# Altium schematic symbol library LTSpiceLibrary.SchLib: 776 symbols (part 2 of 3) (continued)
## LT6109-1
designator X?  value LT6109-1  InstName: X?
Prefix: X; Description: High Side Current Sense Amplifier with Reference and Comparators\n\nNote: The reset signal must be applied on startup.  Model does not reflect this.; SpiceModel: LTC5.lib; Value2: LT6109-1
pins: 1 SenseLo, 2 EN/_RST, 3 OutC2, 4 OutC1, 5 V-, 6 INC1, 7 INC2, 8 OutA, 9 V+, 10 SenseHi

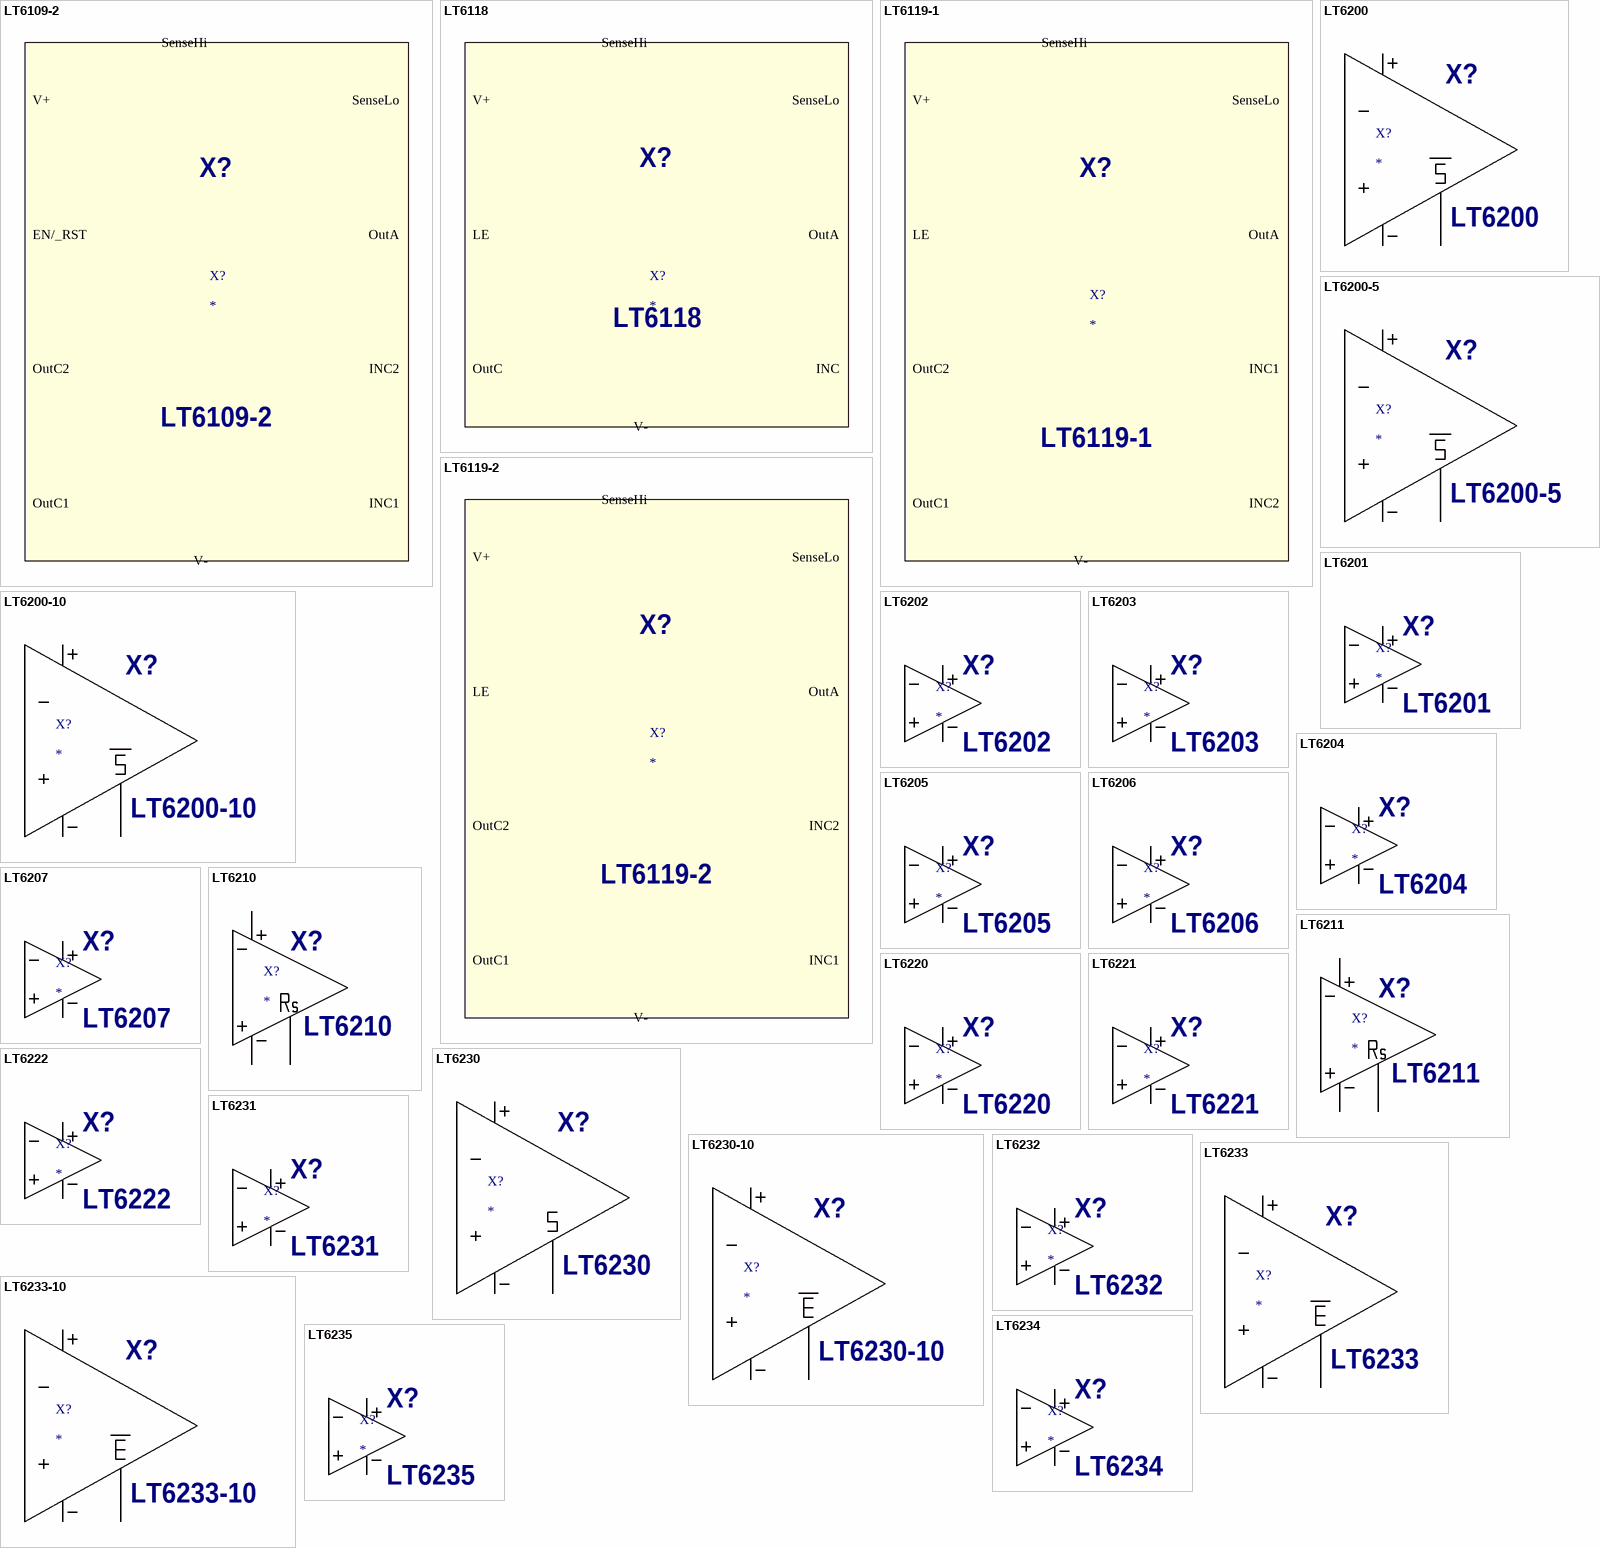
[diagram p15: symbols LT6109-2 to LT6235]

## LT6109-2
designator X?  value LT6109-2  InstName: X?
Prefix: X; Description: High Side Current Sense Amplifier with Reference and Comparators\n\nNote: The reset signal must be applied on startup.  Model does not reflect this.; SpiceModel: LTC5.lib; Value2: LT6109-2
pins: 1 SenseLo, 2 EN/_RST, 3 OutC2, 4 OutC1, 5 V-, 6 INC1, 7 INC2, 8 OutA, 9 V+, 10 SenseHi

## LT6118
designator X?  value LT6118  InstName: X?
Prefix: X; Description: Current Sense Amplifier Reference and Comparator with POR; SpiceModel: LTC5.lib; Value2: LT6118
pins: 1 SenseLo, 2 LE, 3 OutC, 4 V-, 5 INC, 6 OutA, 7 V+, 8 SenseHi

## LT6119-1
designator X?  value LT6119-1  InstName: X?
Prefix: X; Description: Current Sense Amplifier, Reference and Comparators with POR; SpiceModel: LTC5.lib; Value2: LT6119-1
pins: 1 SenseLo, 2 LE, 3 OutC2, 4 OutC1, 5 V-, 6 INC1, 7 INC2, 8 OutA, 9 V+, 10 SenseHi

## LT6119-2
designator X?  value LT6119-2  InstName: X?
Prefix: X; Description: Current Sense Amplifier, Reference and Comparators with POR; SpiceModel: LTC5.lib; Value2: LT6119-2
pins: 1 SenseLo, 2 LE, 3 OutC2, 4 OutC1, 5 V-, 6 INC1, 7 INC2, 8 OutA, 9 V+, 10 SenseHi

## LT6200
designator X?  value LT6200  InstName: X?
Prefix: X; Description: 165 MHz, Rail-to-Rail Input and Output, 0.95nV/rtHz Low Noise Op Amp; SpiceModel: LTC2.LIB; Value2: LT6200
pins: 1 IN+, 2 IN-, 3 OUT, 4 VCC, 5 VEE, 6 SHDN_L

## LT6200-5
designator X?  value LT6200-5  InstName: X?
Prefix: X; Description: 800MHz, Av=5 Rail-to-Rail Low Noise Op Amp; SpiceModel: LTC2.LIB; Value2: LT6200-5
pins: 1 IN+, 2 IN-, 3 OUT, 4 VCC, 5 VEE, 6 SHDN_L

## LT6200-10
designator X?  value LT6200-10  InstName: X?
Prefix: X; Description: 1600MHz, Av=10 Rail-to-Rail Low Noise Op Amp; SpiceModel: LTC2.LIB; Value2: LT6200-10
pins: 1 IN+, 2 IN-, 3 OUT, 4 VCC, 5 VEE, 6 SHDN_L

## LT6201
designator X?  value LT6201  InstName: X?
Prefix: X; Description: Dual 165 MHz, Rail-to-Rail, 0.95 nV/rtHz Low Noise Op Amp; SpiceModel: LTC2.LIB; Value2: LT6201
pins: 1 IN+, 2 IN-, 3 OUT, 4 VCC, 5 VEE

## LT6202
designator X?  value LT6202  InstName: X?
Prefix: X; Description: 100 MHz, Rail-to-Rail, 1.9nV/rtHz Low Power Op Amp; SpiceModel: LTC2.LIB; Value2: LT6202
pins: 1 IN+, 2 IN-, 3 OUT, 4 VCC, 5 VEE

## LT6203
designator X?  value LT6203  InstName: X?
Prefix: X; Value2: LT6202; Description: Dual 100 MHz, Rail-to-Rail, 1.9nV/rtHz Low Power Op Amp; SpiceModel: LTC2.LIB
pins: 1 IN+, 2 IN-, 3 OUT, 4 VCC, 5 VEE

## LT6204
designator X?  value LT6204  InstName: X?
Prefix: X; Value2: LT6202; Description: Quad 100 MHz, Rail-to-Rail, 1.9nV/rtHz Low Power Op Amp; SpiceModel: LTC2.LIB
pins: 1 IN+, 2 IN-, 3 OUT, 4 VCC, 5 VEE

## LT6205
designator X?  value LT6205  InstName: X?
Prefix: X; Description: Single Supply 3V, 100MHz Video Op Amp; SpiceModel: LTC2.LIB; Value2: LT6205
pins: 1 IN+, 2 IN-, 3 OUT, 4 VCC, 5 VEE

## LT6206
designator X?  value LT6206  InstName: X?
Prefix: X; Value2: LT6205; Description: Dual Single Supply 3V, 100MHz Video Op Amp; SpiceModel: LTC2.LIB
pins: 1 IN+, 2 IN-, 3 OUT, 4 VCC, 5 VEE

## LT6207
designator X?  value LT6207  InstName: X?
Prefix: X; Value2: LT6205; Description: Quad Single Supply 3V, 100MHz Video Op Amp; SpiceModel: LTC2.LIB
pins: 1 IN+, 2 IN-, 3 OUT, 4 VCC, 5 VEE

## LT6210
designator X?  value LT6210  InstName: X?
Prefix: X; Description: Programmable Supply Current, R-R Output, Current Feedback Amplifier; SpiceModel: LTC4.lib; Value2: LT6210
pins: 1 In+, 2 In-, 3 V+, 4 V-, 5 OUT, 6 V-1

## LT6211
designator X?  value LT6211  InstName: X?
Prefix: X; Value2: LT6210; Description: Dual Programmable Supply Current, R-R Output, Current Feedback Amplifier; SpiceModel: LTC4.lib
pins: 1 In+, 2 In-, 3 V+, 4 V-, 5 OUT, 6 V-1

## LT6220
designator X?  value LT6220  InstName: X?
Prefix: X; Description: 60MHz, 20V/�s, Low Power, RRIO Precision Op Amp; SpiceModel: LTC4.LIB; Value2: LT6220
pins: 1 IN+, 2 IN-, 3 VCC, 4 VEE, 5 OUT

## LT6221
designator X?  value LT6221  InstName: X?
Prefix: X; Value2: LT6220; Description: Dual 60MHz, 20V/�s, Low Power, RRIO Precision Op Amp; SpiceModel: LTC4.LIB
pins: 1 IN+, 2 IN-, 3 VCC, 4 VEE, 5 OUT

## LT6222
designator X?  value LT6222  InstName: X?
Prefix: X; Value2: LT6220; Description: Quad 60MHz, 20V/�s, Low Power, RRIO Precision Op Amp; SpiceModel: LTC4.LIB
pins: 1 IN+, 2 IN-, 3 VCC, 4 VEE, 5 OUT

## LT6230
designator X?  value LT6230  InstName: X?
Prefix: X; Description: 215 MHz, Rail-to-Rail Output, 1.1nV/rtHz, 3.4mA Op Amp; SpiceModel: LTC2.LIB; Value2: LT6230
pins: 1 IN+, 2 IN-, 3 OUT, 4 VCC, 5 VEE, 6 SHDN

## LT6230-10
designator X?  value LT6230-10  InstName: X?
Prefix: X; Description: 1.45GHz, Av=10, Rail-to-Rail Output, Low Noise, 3.4mA Op Amp; SpiceModel: LTC2.LIB; Value2: LT6230-10
pins: 1 IN+, 2 IN-, 3 OUT, 4 VCC, 5 VEE, 6 EN_L

## LT6231
designator X?  value LT6231  InstName: X?
Prefix: X; Description: Dual 215 MHz, Rail-to-Rail Output, 1.1nV/rtHz, 3.4mA Op Amp; SpiceModel: LTC2.LIB; Value2: LT6231
pins: 1 IN+, 2 IN-, 3 OUT, 4 VCC, 5 VEE

## LT6232
designator X?  value LT6232  InstName: X?
Prefix: X; Value2: LT6231; Description: Quad 215 MHz, Rail-to-Rail Output, 1.1nV/rtHz, 3.4mA Op Amp; SpiceModel: LTC2.LIB
pins: 1 IN+, 2 IN-, 3 OUT, 4 VCC, 5 VEE

## LT6233
designator X?  value LT6233  InstName: X?
Prefix: X; Description: 60MHz, Rail-to-Rail Output, 1.9nV/rtHz, 1.2mA Op Amp; SpiceModel: LTC2.LIB; Value2: LT6233
pins: 1 IN+, 2 IN-, 3 OUT, 4 VCC, 5 VEE, 6 EN_L

## LT6233-10
designator X?  value LT6233-10  InstName: X?
Prefix: X; Description: 375MHz, AV=10, Rail-to-Rail Output, 1.9nV/rtHz, 1.2mA Op Amp; SpiceModel: LTC2.LIB; Value2: LT6233-10
pins: 1 IN+, 2 IN-, 3 OUT, 4 VCC, 5 VEE, 6 EN_L

## LT6234
designator X?  value LT6234  InstName: X?
Prefix: X; Description: Dual 60MHz, Rail-to-Rail Output, 1.9nV/rtHz, 1.2mA Op Amp; SpiceModel: LTC2.LIB; Value2: LT6234
pins: 1 IN+, 2 IN-, 3 OUT, 4 VCC, 5 VEE

## LT6235
designator X?  value LT6235  InstName: X?
Prefix: X; Value2: LT6234; Description: Quad 60MHz, Rail-to-Rail Output, 1.9nV/rtHz, 1.2mA Op Amp; SpiceModel: LTC2.LIB
pins: 1 IN+, 2 IN-, 3 OUT, 4 VCC, 5 VEE

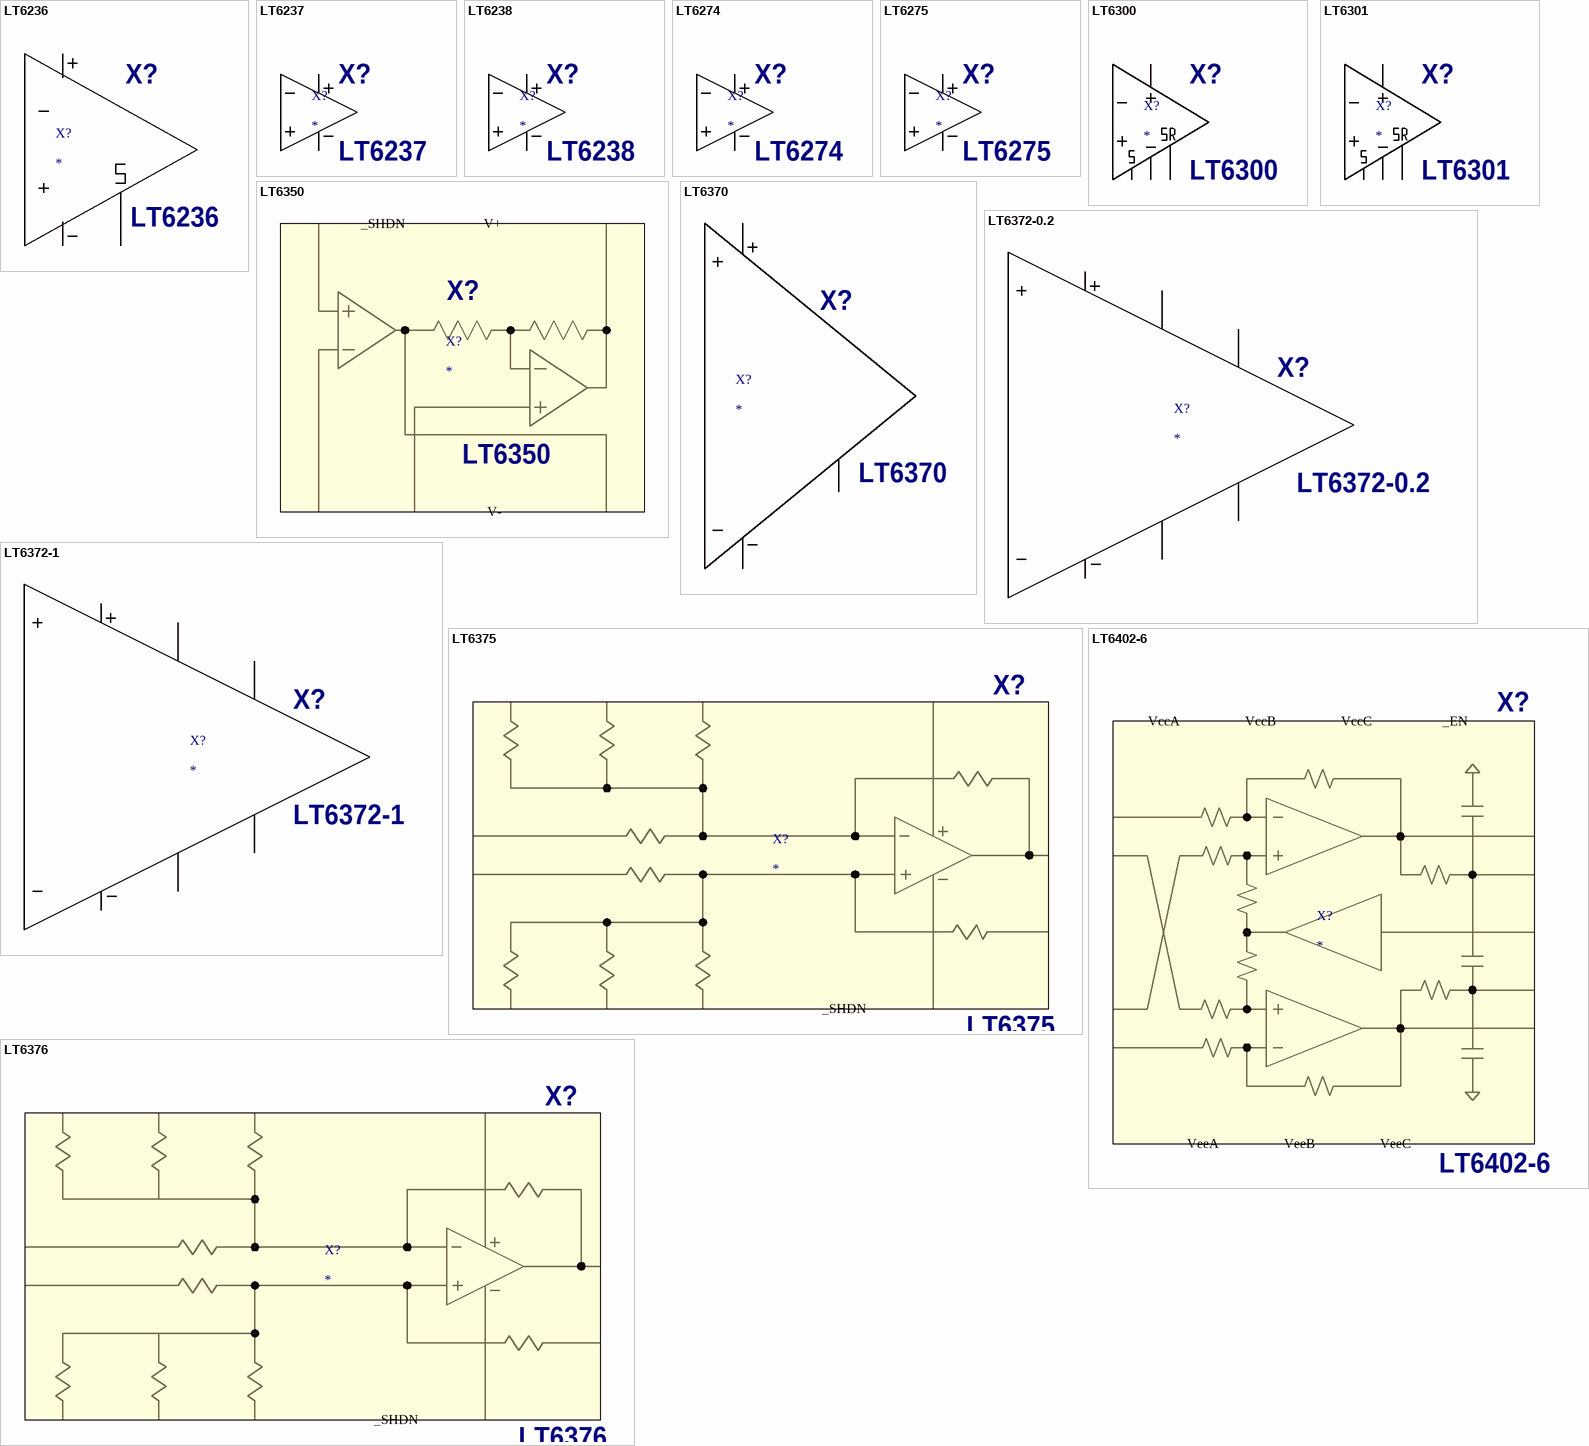
[diagram p16: symbols LT6236 to LT6402-6]

## LT6236
designator X?  value LT6236  InstName: X?
Prefix: X; Description: 215 MHz, Rail-to-Rail Output, 1.1nV/rtHz Op Amp/SAR ADC Driver; SpiceModel: LTC7.lib; Value2: LT6236
pins: 1 IN+, 2 IN-, 3 OUT, 4 VCC, 5 VEE, 6 SHDN

## LT6237
designator X?  value LT6237  InstName: X?
Prefix: X; Description: Dual 215 MHz, Rail-to-Rail Output, 1.1nV/rtHz Op Amp/SAR ADC Driver; SpiceModel: LTC7.lib; Value2: LT6237
pins: 1 IN+, 2 IN-, 3 OUT, 4 VCC, 5 VEE

## LT6238
designator X?  value LT6238  InstName: X?
Prefix: X; Value2: LT6237; Description: Quad 215 MHz, Rail-to-Rail Output, 1.1nV/rtHz Op Amp/SAR ADC Driver; SpiceModel: LTC7.lib
pins: 1 IN+, 2 IN-, 3 OUT, 4 VCC, 5 VEE

## LT6274
designator X?  value LT6274  InstName: X?
Prefix: X; Value2: LT6275; Description: 90MHz, 2200V/�s 30V Low Power Op Amp; SpiceModel: LTC7.lib
pins: 1 In+, 2 In-, 3 V+, 4 V-, 5 OUT

## LT6275
designator X?  value LT6275  InstName: X?
Prefix: X; Description: Dual 90MHz, 2200V/�s 30V Low Power Op Amp; SpiceModel: LTC7.lib; Value2: LT6275
pins: 1 In+, 2 In-, 3 V+, 4 V-, 5 OUT

## LT6300
designator X?  value LT6300  InstName: X?
Prefix: X; Value2: LT1794; Description: 500mA, 200MHz xDSL Line Driver in 16-Lead SSOP Package; SpiceModel: LTC1.lib
pins: 1 In+, 2 In-, 3 V+, 4 V-, 5 OUT, 6 S, 7 SR

## LT6301
designator X?  value LT6301  InstName: X?
Prefix: X; Value2: LT1794; Description: Dual 500mA, Differential  xDSL Line Driver in 28-Lead TSSOP Package; SpiceModel: LTC1.lib
pins: 1 In+, 2 In-, 3 V+, 4 V-, 5 OUT, 6 S, 7 SR

## LT6350
designator X?  value LT6350  InstName: X?
Prefix: X; Description: Single-Ended to Differential Converter/ADC Driver; Value2: LT6350; SpiceModel: LTC7.lib
pins: 1 -IN1, 2 +IN2, 3 V+, 4 OUT1, 5 OUT2, 6 V-, 7 _SHDN, 8 +IN1

## LT6370
designator X?  value LT6370  InstName: X?
Prefix: X; Description: Precision, Low Drift, Low Noise, Instrumentation Amplifier; SpiceModel: LTC1.lib; Value2: LT6370
pins: 1 -RG, 2 IN-, 3 IN+, 4 -V, 5 REF, 6 OUT, 7 +V, 8 +RG

## LT6372-0.2
designator X?  value LT6372-0.2  InstName: X?
Prefix: X; Description: Precision, Low Drift, Low Noise, Funneling Instrumentation Amplifier; SpiceModel: LT6372-0.2.sub; Value2: LT6372-0.2
pins: 1 -RGF, 2 IN-, 3 IN+, 4 -V, 5 REF1, 6 OUT, 7 +V, 8 +RGF, 9 -RGS, 10 +RGS, 11 REF2, 12 CLHI, 13 CLLO

## LT6372-1
designator X?  value LT6372-1  InstName: X?
Prefix: X; Description: Precision, Low Drift, Low Noise, Instrumentation Amplifier; SpiceModel: LTC2.lib; Value2: LT6372-1
pins: 1 -RGF, 2 IN-, 3 IN+, 4 -V, 5 REF1, 6 OUT, 7 +V, 8 +RGF, 9 -RGS, 10 +RGS, 11 REF2, 12 CLHI, 13 CLLO

## LT6375
designator X?  value LT6375  InstName: X?
Prefix: X; Description: +/-270 Volt Common Mode Voltage Difference Amplifier; SpiceModel: LTC3.lib; Value2: LT6375
pins: 1 +IN, 2 +REFA, 3 +REFB, 4 +REFC, 5 REF, 6 _SHDN, 7 OUT, 8 V+, 9 -REFC, 10 -REFB, 11 -REFA, 12 -IN, 13 V-

## LT6376
designator X?  value LT6376  InstName: X?
Prefix: X; Description: +/-110 Volt Common Mode Voltage G=10 Difference Amplifier; SpiceModel: LTC5.lib; Value2: LT6376
pins: 1 +IN, 2 +REFA, 3 +REFB, 4 +REFC, 5 REF, 6 _SHDN, 7 OUT, 8 V+, 9 -REFC, 10 -REFB, 11 -REFA, 12 -IN, 13 V-

## LT6402-6
designator X?  value LT6402-6  InstName: X?
Prefix: X; Description: 300MHz Low Distortion, Low Noise Differential Amplifier/ADC Driver; SpiceModel: LTC5.lib; Value2: LT6402-6
pins: 1 VccC, 2 VOCM, 3 VccA, 4 VeeA, 5 +OUT, 6 +OUTFILT, 7 -OUTFILT, 8 -OUT, 9 VeeB, 10 VccB, 11 _EN, 12 VeeC, 13 -INB, 14 -INA, 15 +INB, 16 +INA

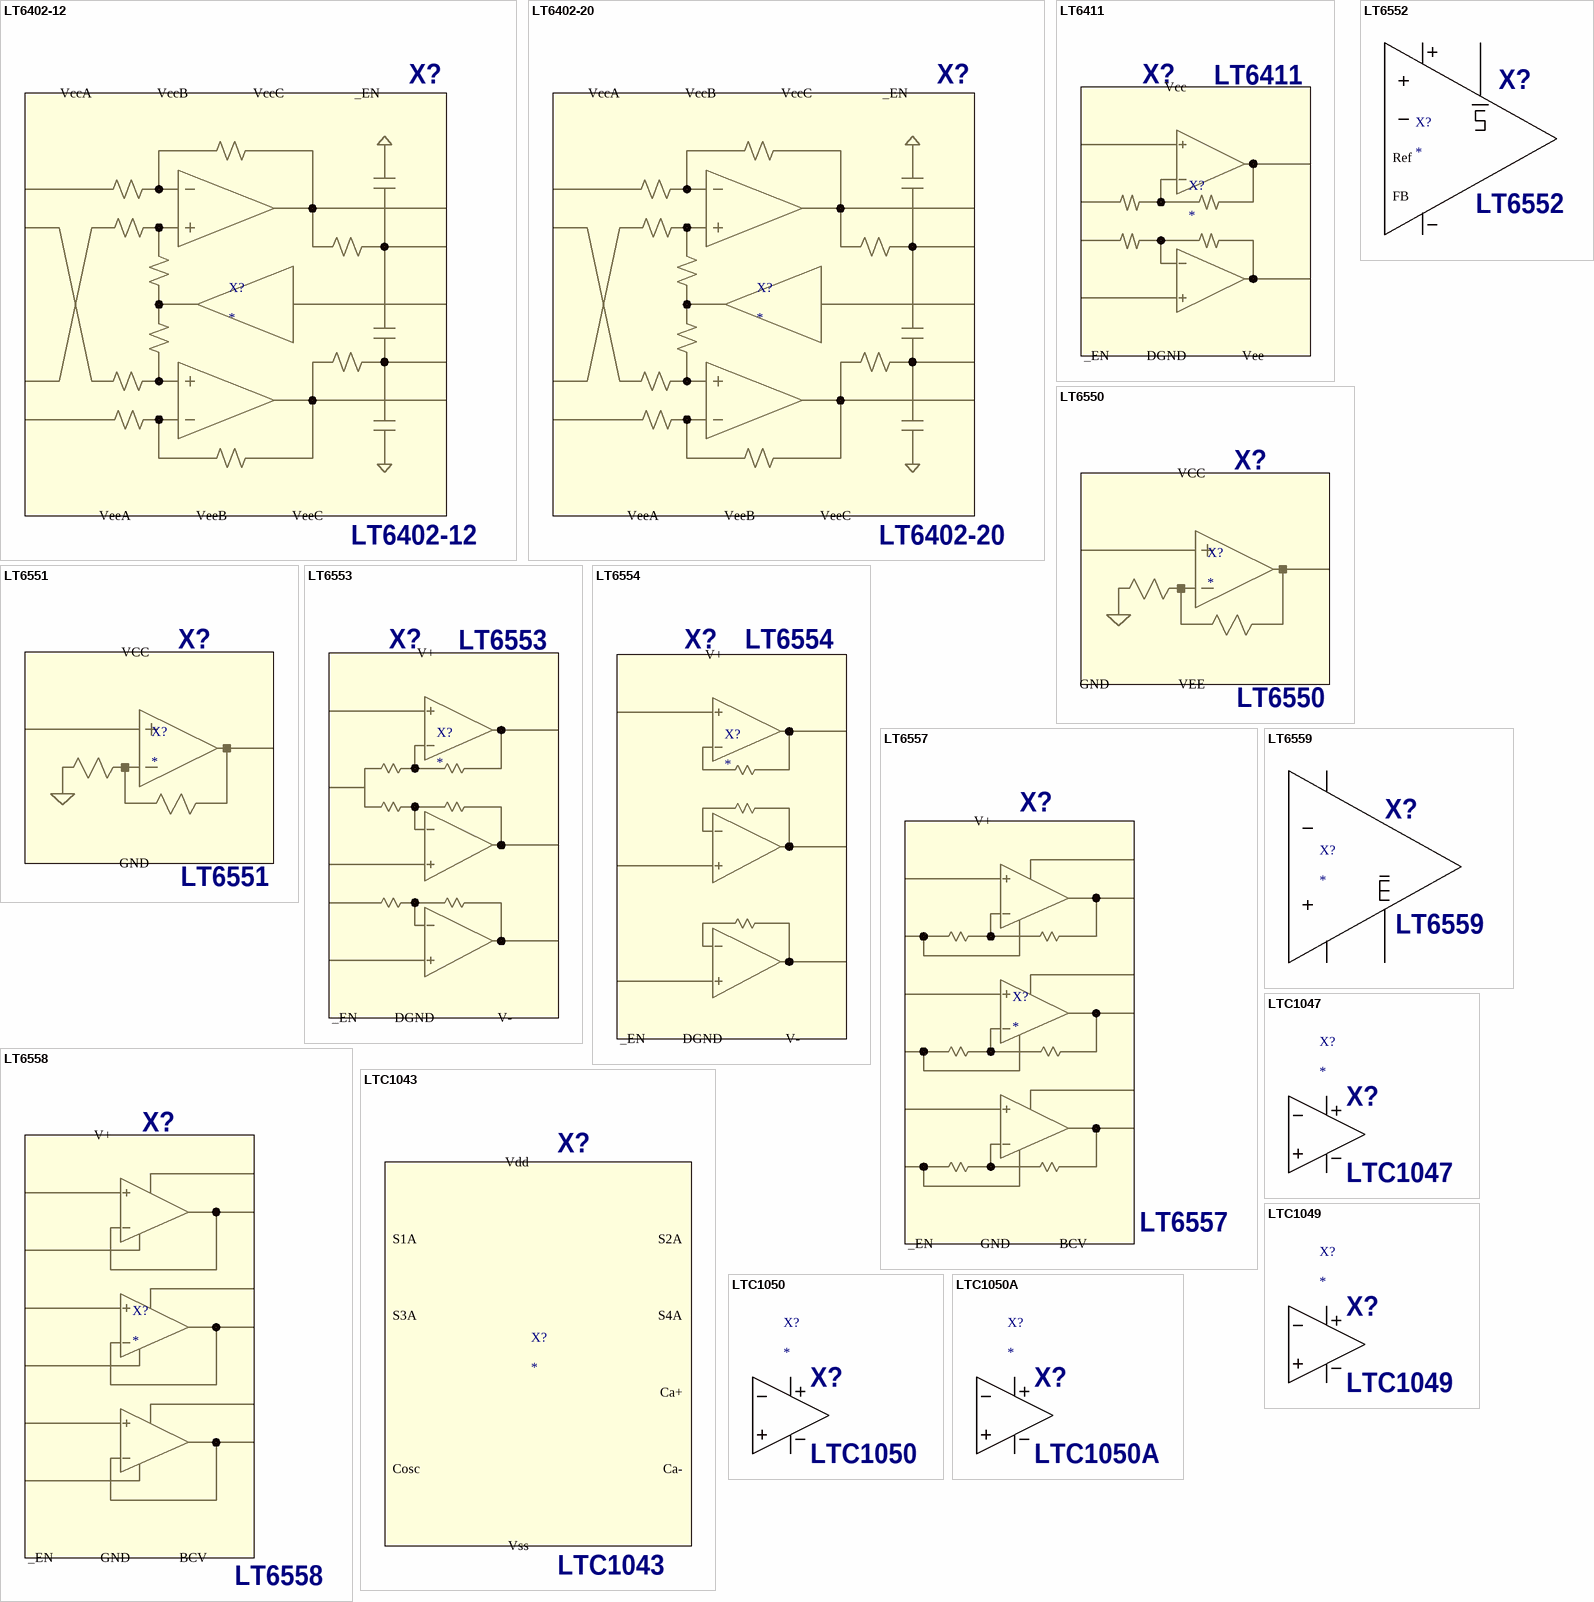
[diagram p17: symbols LT6402-12 to LTC1050A]

## LT6402-12
designator X?  value LT6402-12  InstName: X?
Prefix: X; Description: 300MHz Low Distortion, Low Noise Differential Amplifier/ADC Driver; SpiceModel: LTC5.lib; Value2: LT6402-12
pins: 1 VccC, 2 VOCM, 3 VccA, 4 VeeA, 5 +OUT, 6 +OUTFILT, 7 -OUTFILT, 8 -OUT, 9 VeeB, 10 VccB, 11 _EN, 12 VeeC, 13 -INB, 14 -INA, 15 +INB, 16 +INA

## LT6402-20
designator X?  value LT6402-20  InstName: X?
Prefix: X; Description: 300MHz Low Distortion, Low Noise Differential Amplifier/ADC Driver; SpiceModel: LTC5.lib; Value2: LT6402-20
pins: 1 VccC, 2 VOCM, 3 VccA, 4 VeeA, 5 +OUT, 6 +OUTFILT, 7 -OUTFILT, 8 -OUT, 9 VeeB, 10 VccB, 11 _EN, 12 VeeC, 13 -INB, 14 -INA, 15 +INB, 16 +INA

## LT6411
designator X?  value LT6411  InstName: X?
Prefix: X; Description: 650MHz Differential ADC Driver/Dual Selectable Gain Amplifier; SpiceModel: LTC4.lib; Value2: LT6411
pins: 1 Vee, 2 OUT2, 3 Vcc, 4 OUT1, 5 _EN, 6 DGND, 7 IN1+, 8 IN1-, 9 IN2-, 10 IN2+

## LT6550
designator X?  value LT6550  InstName: X?
Prefix: X; Description: 3.3V Triple Video Amplifier; SpiceModel: LTC2.LIB; Value2: LT6550
pins: 1 IN, 2 GND, 3 VCC, 4 VEE, 5 OUT

## LT6551
designator X?  value LT6551  InstName: X?
Prefix: X; Description: 3.3V Quad Video Amplifier; SpiceModel: LTC2.LIB; Value2: LT6551
pins: 1 IN, 2 GND, 3 VCC, 4 OUT

## LT6552
designator X?  value LT6552  InstName: X?
Prefix: X; Description: 3.3V Single Supply Video Difference Amplifier; SpiceModel: LTC5.lib; Value2: LT6552
pins: 1 Ref, 2 IN-, 3 IN+, 4 VEE, 5 SHDN_L, 6 OUT, 7 VCC, 8 FB

## LT6553
designator X?  value LT6553  InstName: X?
Prefix: X; Description: 650MHz Gain of 2 Triple Video Amplifier; SpiceModel: LTC4.lib; Value2: LT6553
pins: 1 _EN, 2 DGND, 3 INR, 4 AGND1, 5 ING, 6 AGND2, 7 INB, 8 V-, 9 OUTB, 10 V+, 11 OUTG, 12 OUTR

## LT6554
designator X?  value LT6554  InstName: X?
Prefix: X; Description: 650MHz Gain of 1 Triple Video Buffer; SpiceModel: LTC4.lib; Value2: LT6554
pins: 1 _EN, 2 DGND, 3 V+, 4 V-, 5 INR, 6 ING, 7 INB, 8 OUTR, 9 OUTG, 10 OUTB

## LT6557
designator X?  value LT6557  InstName: X?
Prefix: X; Description: 500MHz, 2200V/�s Gain of 2, Single Supply Triple Video Amplifier with Input Bias Control; SpiceModel: LTC5.lib; Value2: LT6557
pins: 1 _EN, 2 GND, 3 INR, 4 AGND1, 5 ING, 6 GNDG, 7 INB, 8 GNDB, 9 V+B, 10 OUTB, 11 V+G, 12 OUTG, 13 V+R, 14 OUTR, 15 V+, 16 BCV

## LT6558
designator X?  value LT6558  InstName: X?
Prefix: X; Description: 550MHz, 2200V/�s Gain of 1, Single Supply Triple Video Amplifier with Input Bias Control; SpiceModel: LTC5.lib; Value2: LT6558
pins: 1 _EN, 2 GND, 3 INR, 4 AGND1, 5 ING, 6 GNDG, 7 INB, 8 GNDB, 9 V+B, 10 OUTB, 11 V+G, 12 OUTG, 13 V+R, 14 OUTR, 15 V+, 16 BCV

## LT6559
designator X?  value LT6559  InstName: X?
Prefix: X; Description: Low Cost 5V/�5V 300MHz Triple Video Amplifier in QFN; SpiceModel: LTC5.lib; Value2: LT6559
pins: 1 In+, 2 In-, 3 V+, 4 V-, 5 OUT, 6 SHDN

## LTC1043
designator X?  value LTC1043  InstName: X?
Prefix: X; Description: Dual Instrumentation Switched Capacitor Building Block; SpiceModel: LTC.lib; Value2: LTC1043
pins: 1 S1A, 2 S2A, 3 Ca+, 4 S3A, 5 S4A, 6 Ca-, 7 Cosc, 8 Vdd, 9 Vss

## LTC1047
designator X?  value LTC1047  InstName: X?
Prefix: X; Description: Dual �Power Chopper Stabilized Operational Amplifier with Internal Capacitors; SpiceModel: LTC.lib; Value2: LTC1047
pins: 1 In+, 2 In-, 3 V+, 4 V-, 5 OUT

## LTC1049
designator X?  value LTC1049  InstName: X?
Prefix: X; Description: Precision Low Power Zero-Drift Operational Amplifier with Internal Capacitors; SpiceModel: LTC.lib; Value2: LTC1049
pins: 1 In+, 2 In-, 3 V+, 4 V-, 5 OUT

## LTC1050
designator X?  value LTC1050  InstName: X?
Prefix: X; Description: Precision Zero-Drift Operational Amplifier with Internal Capacitors; SpiceModel: LTC.lib; Value2: LTC1050
pins: 1 In+, 2 In-, 3 V+, 4 V-, 5 OUT

## LTC1050A
designator X?  value LTC1050A  InstName: X?
Prefix: X; Value2: LTC1050; Description: Precision Zero-Drift Operational Amplifier with Internal Capacitors; SpiceModel: LTC.lib
pins: 1 In+, 2 In-, 3 V+, 4 V-, 5 OUT

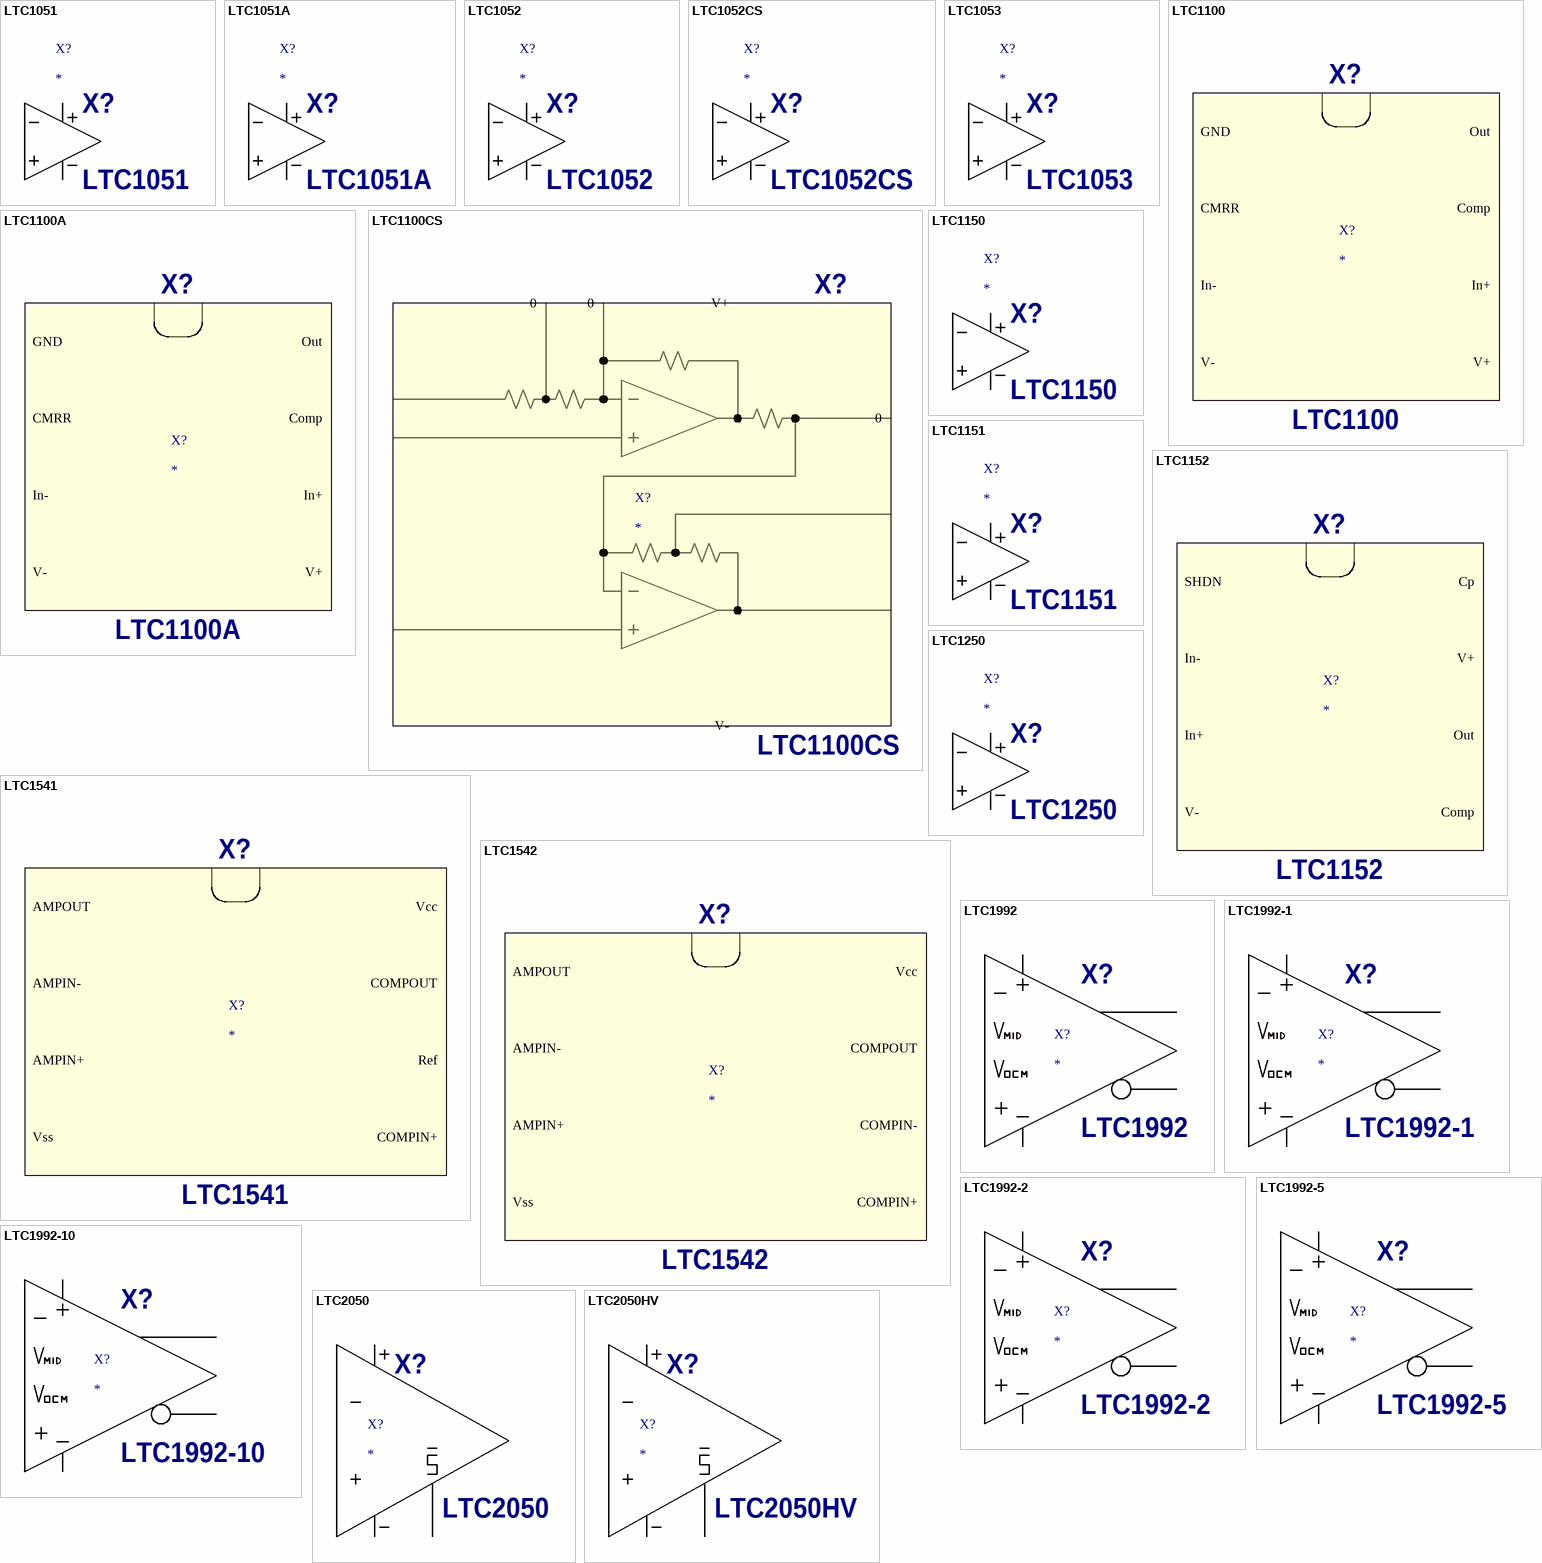
[diagram p18: symbols LTC1051 to LTC2050HV]

## LTC1051
designator X?  value LTC1051  InstName: X?
Prefix: X; Description: Dual Precision Zero-Drift Operational Amplifier with Internal Capacitors; SpiceModel: LTC.lib; Value2: LTC1051
pins: 1 In+, 2 In-, 3 V+, 4 V-, 5 OUT

## LTC1051A
designator X?  value LTC1051A  InstName: X?
Prefix: X; Value2: LTC1051; Description: Dual Precision Zero-Drift Operational Amplifier with Internal Capacitors; SpiceModel: LTC.lib
pins: 1 In+, 2 In-, 3 V+, 4 V-, 5 OUT

## LTC1052
designator X?  value LTC1052  InstName: X?
Prefix: X; Description: Chopper-Stabilized Operational Amplifier; SpiceModel: LTC.lib; Value2: LTC1052
pins: 1 In+, 2 In-, 3 V+, 4 V-, 5 OUT

## LTC1052CS
designator X?  value LTC1052CS  InstName: X?
Prefix: X; Value2: LTC1052; Description: Chopper-Stabilized Operational Amplifier; SpiceModel: LTC.lib
pins: 1 In+, 2 In-, 3 V+, 4 V-, 5 OUT

## LTC1053
designator X?  value LTC1053  InstName: X?
Prefix: X; Value2: LTC1052; Description: Quad Precision Zero-Drift Operational Amplifier with Internal Capacitors; SpiceModel: LTC.lib
pins: 1 In+, 2 In-, 3 V+, 4 V-, 5 OUT

## LTC1100
designator X?  value LTC1100  InstName: X?
Prefix: X; Description: Precision, Chopper-Stabilized Instrumentation Amplifier; SpiceModel: LTC.lib; Value2: LTC1100
pins: 1 GND, 2 CMRR, 3 In-, 4 V-, 5 V+, 6 In+, 7 Comp, 8 Out

## LTC1100A
designator X?  value LTC1100A  InstName: X?
Prefix: X; Value2: LTC1100; Description: Precision, Chopper-Stabilized Instrumentation Amplifier; SpiceModel: LTC.lib
pins: 1 GND, 2 CMRR, 3 In-, 4 V-, 5 V+, 6 In+, 7 Comp, 8 Out

## LTC1100CS
designator X?  value LTC1100CS  InstName: X?
Prefix: X; Description: Precision, Zero-Drift Instrumentation Amplifier; SpiceModel: LTC1100CS.sub; Value2: LTC1100CS
pins: 0, 0, 0, 0, 0, 0, 0, 1 -INA, 5 V-, 6 V+

## LTC1150
designator X?  value LTC1150  InstName: X?
Prefix: X; Description: +-15V Zero-Drift Operational Amplifier with Internal Capacitors; SpiceModel: LTC.lib; Value2: LTC1150
pins: 1 In+, 2 In-, 3 V+, 4 V-, 5 OUT

## LTC1151
designator X?  value LTC1151  InstName: X?
Prefix: X; Description: Dual +-15V Zero-Drift Operational Amplifier; SpiceModel: LTC.lib; Value2: LTC1151
pins: 1 In+, 2 In-, 3 V+, 4 V-, 5 OUT

## LTC1152
designator X?  value LTC1152  InstName: X?
Prefix: X; Description: Rail-to-Rail Input and Output Zero-Drift Operational Amplifier; SpiceModel: LTC.lib; Value2: LTC1152
pins: 1 In+, 2 In-, 3 V+, 4 V-, 5 Out, 6 Comp, 7 SHDN, 8 Cp

## LTC1250
designator X?  value LTC1250  InstName: X?
Prefix: X; Description: Very Low Noise Zero-Drift Bridge Amplifier; SpiceModel: LTC.lib; Value2: LTC1250
pins: 1 In+, 2 In-, 3 V+, 4 V-, 5 OUT

## LTC1541
designator X?  value LTC1541  InstName: X?
Prefix: X; Description: �Power Operational Amplifier, Comparator and Reference; SpiceModel: LTC.lib; Value2: LTC1541
pins: 1 AMPOUT, 2 AMPIN-, 3 AMPIN+, 4 Vss, 5 COMPIN+, 6 Ref, 7 COMPOUT, 8 Vcc